# Altium footprint library ABSDataSystem_PartsLibrary.PcbLib: 50 footprints (part 4 of 4)
Each footprint in its own frame and in the unit in brackets; x right, y up, seen from the top. Pads: shape width x height; smd on the part's side, far side on the other; paste and mask are expansions set on the pad; w line width, h text height; cw(c..) or ccw(c..) is an arc to the next point about the centre after c.
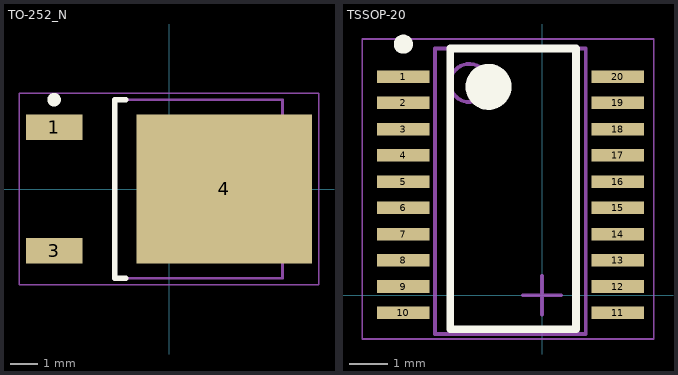
[diagram p3: the footprints below, top view; thin cyan lines are the x and y axes]

## TO-252_N [mm] "D-PAK, 4-Leads, Body 6.1x6.5mm, Pitch 2.28mm, Lead Span 9.7mm, IPC Medium Density"
height 2.4
pads (3):
  rect 2.1x0.95 smd: 1(-4.25,2.28) 3(-4.25,-2.28)
  rect 6.5x5.5 smd: 4(2.05,0)
Top Overlay:
  circle w0.25: c-4.25,3.305 r0.125
  lines w0.2: -1.6,-3.3 -2,-3.3 -2,3.3 -1.6,3.3
Mechanical 13:
  lines w0.1: -2,-3.3 -2,3.3 4.2,3.3 4.2,-3.3 -2,-3.3
Mechanical 15:
  lines w0.05: -5.55,-3.55 -5.55,3.55 5.55,3.55 5.55,-3.55 -5.55,-3.55
  lines w0.1: -0.5,0 0.5,0 ; 0,-0.5 0,0.5
3D body: height 2.4, standoff 0, extent -2,-3.3 4.2,3.3

## TSSOP-20 [mil] "SOP, 20-Leads, Body 12.60x5.30mm, Pitch 1.27mm, IPC Medium Density"
height 78.74
pads (20):
  rect 54x13 smd: 1(-142.72,225) 2(-142.72,198) 3(-142.72,171) 4(-142.72,144) 5(-142.72,117) 6(-142.72,90) 7(-142.72,63) 8(-142.72,36) 9(-142.72,9) 10(-142.72,-18) 11(78,-18) 12(78,9) 13(78,36) 14(78,63) 15(78,90) 16(78,117) 17(78,144) 18(78,171) 19(78,198) 20(78,225)
Top Overlay:
  circle w23.62: c-55.12,214.57 r11.81
  circle w9.84: c-142.72,258.46 r4.92
  lines w7.87: -94.49,-35 35,-35 35,253.94 -94.49,253.94 -94.49,-35
Mechanical 13:
  circle w3.94: c-74.8,218.5 r19.68
  lines w3.94: -110.24,-40 45,-40 45,253.94 -110.24,253.94 -110.24,-40
Mechanical 15:
  lines w1.97: -185.04,-45 115,-45 115,263.78 -185.04,263.78 -185.04,-45
  lines w3.94: -19.69,0 19.68,0 ; 0,-19.68 0,19.69
3D body: height 78.74, standoff 9.84, extent -110.24,-40 45,253.94